# Altium footprint library std-smt.PcbLib: 117 footprints (part 8 of 8)
Each footprint in its own frame and in the unit in brackets; x right, y up, seen from the top. Pads: shape width x height; smd on the part's side, far side on the other; paste and mask are expansions set on the pad; w line width, h text height; cw(c..) or ccw(c..) is an arc to the next point about the centre after c.
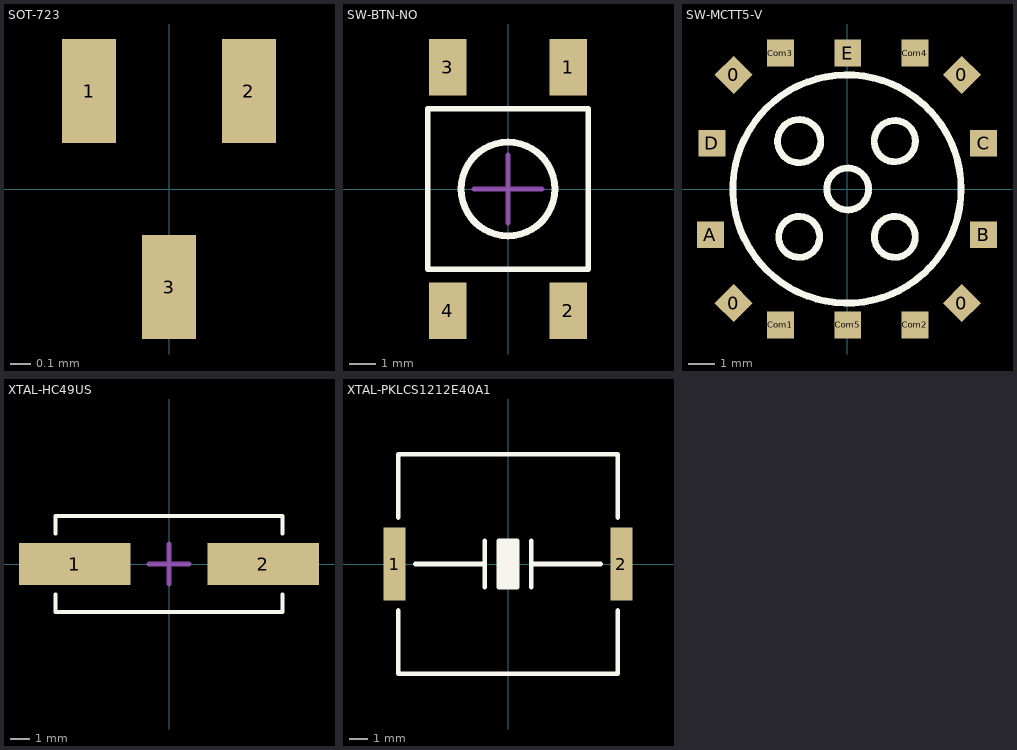
[diagram p7: the footprints below, top view; thin cyan lines are the x and y axes]

## SOT-723 [mm] "SOT-723 package, 0.8 mm pitch"
height 0.5
pads (3):
  rect 0.27x0.52 smd: 1(-0.4,0.49) 2(0.4,0.49) 3(0,-0.49)
3D body: height 0.45, standoff -0.01, extent -0.621,-0.523 0.629,0.527

## SW-BTN-NO [mm] "Pushbutton, NO, SMD"
height 3.5
pads (4):
  rect 1.4x2.1 smd: 1(2.25,4.55) 2(2.25,-4.55) 3(-2.25,4.55) 4(-2.25,-4.55)
Top Overlay:
  circle w0.254: c0,0 r1.75
  lines w0.203: -3,-3 -3,3 3,3 3,-3 -3,-3
Mechanical 15:
  lines w0.203: -1.27,0 1.27,0 ; 0,-1.27 0,1.27
3D body: height 4.44, standoff -0.1, extent -3,-5 3,5

## SW-MCTT5-V [mm] "Switch, tacticle, joystick"
height 1.55
pads (14):
  rect 1x1 smd rot 45: 0(-4.216,-4.243) 0(-4.216,4.243) 0(4.269,-4.243) 0(4.269,4.243)
  rect 1x1 smd: A(-5.076,-1.7) B(5.076,-1.7) C(5.076,1.7) Com1(-2.474,-5.05) Com2(2.527,-5.05) Com3(-2.474,5.05) Com4(2.527,5.05) Com5(0.026,-5.05) D(-5.023,1.7) E(0.026,5.05)
Top Overlay:
  circle w0.254: c0,0 r4.243
  circle w0.254: c0.027,0 r0.778
  circle w0.254: c-1.778,1.778 r0.803
  circle w0.254: c1.778,1.778 r0.766
  circle w0.254: c1.778,-1.778 r0.762
  circle w0.254: c-1.778,-1.778 r0.762
3D body: height 1.55, standoff 0, extent -5.173,-5.2 5.227,5.2

## XTAL-HC49US [mm] "Crystal, SMD, body 450 x 190 mil, ABLS2"
height 4.2
pads (2):
  rect 5.6x2.1 smd: 1(-4.75,0) 2(4.75,0)
Top Overlay:
  lines w0.203: -5.715,-1.524 -5.715,-2.413 5.715,-2.413 5.715,-1.524 ; -5.715,1.524 -5.715,2.413 5.715,2.413 5.715,1.524
Mechanical 15:
  lines w0.254: -1.016,0 1.016,0 ; 0,-1.016 0,1.016
3D body: height 4, standoff 0, extent -6.259,-2.4 6.241,2.4

## XTAL-PKLCS1212E40A1 [mm] "Piezoelectric buzzer, PKLCS1212E40A1-R1"
height 1
pads (2):
  rect 1.2x4 smd: 1(-6.2,0) 2(6.2,0)
Top Overlay:
  region: -0.508,1.27 0.508,1.27 0.508,-1.27 -0.508,-1.27
  lines w0.254: -6,-2.54 -6,-6 6,-6 6,-2.54 ; -6,2.54 -6,6 6,6 6,2.54 ; -5.08,0 -1.27,0 ; -1.27,-1.27 -1.27,1.27 ; 1.27,-1.27 1.27,1.27 ; 1.27,0 5.08,0 ; -0.508,-1.27 0.508,-1.27 0.508,1.27 -0.508,1.27 -0.508,-1.27
3D body: height 3.07, standoff 0, extent -6,-6 6,6